# Altium footprint library LTEWlib.PcbLib: 125 footprints (part 8 of 8)
Each footprint in its own frame and in the unit in brackets; x right, y up, seen from the top. Pads: shape width x height; smd on the part's side, far side on the other; paste and mask are expansions set on the pad; w line width, h text height; cw(c..) or ccw(c..) is an arc to the next point about the centre after c.
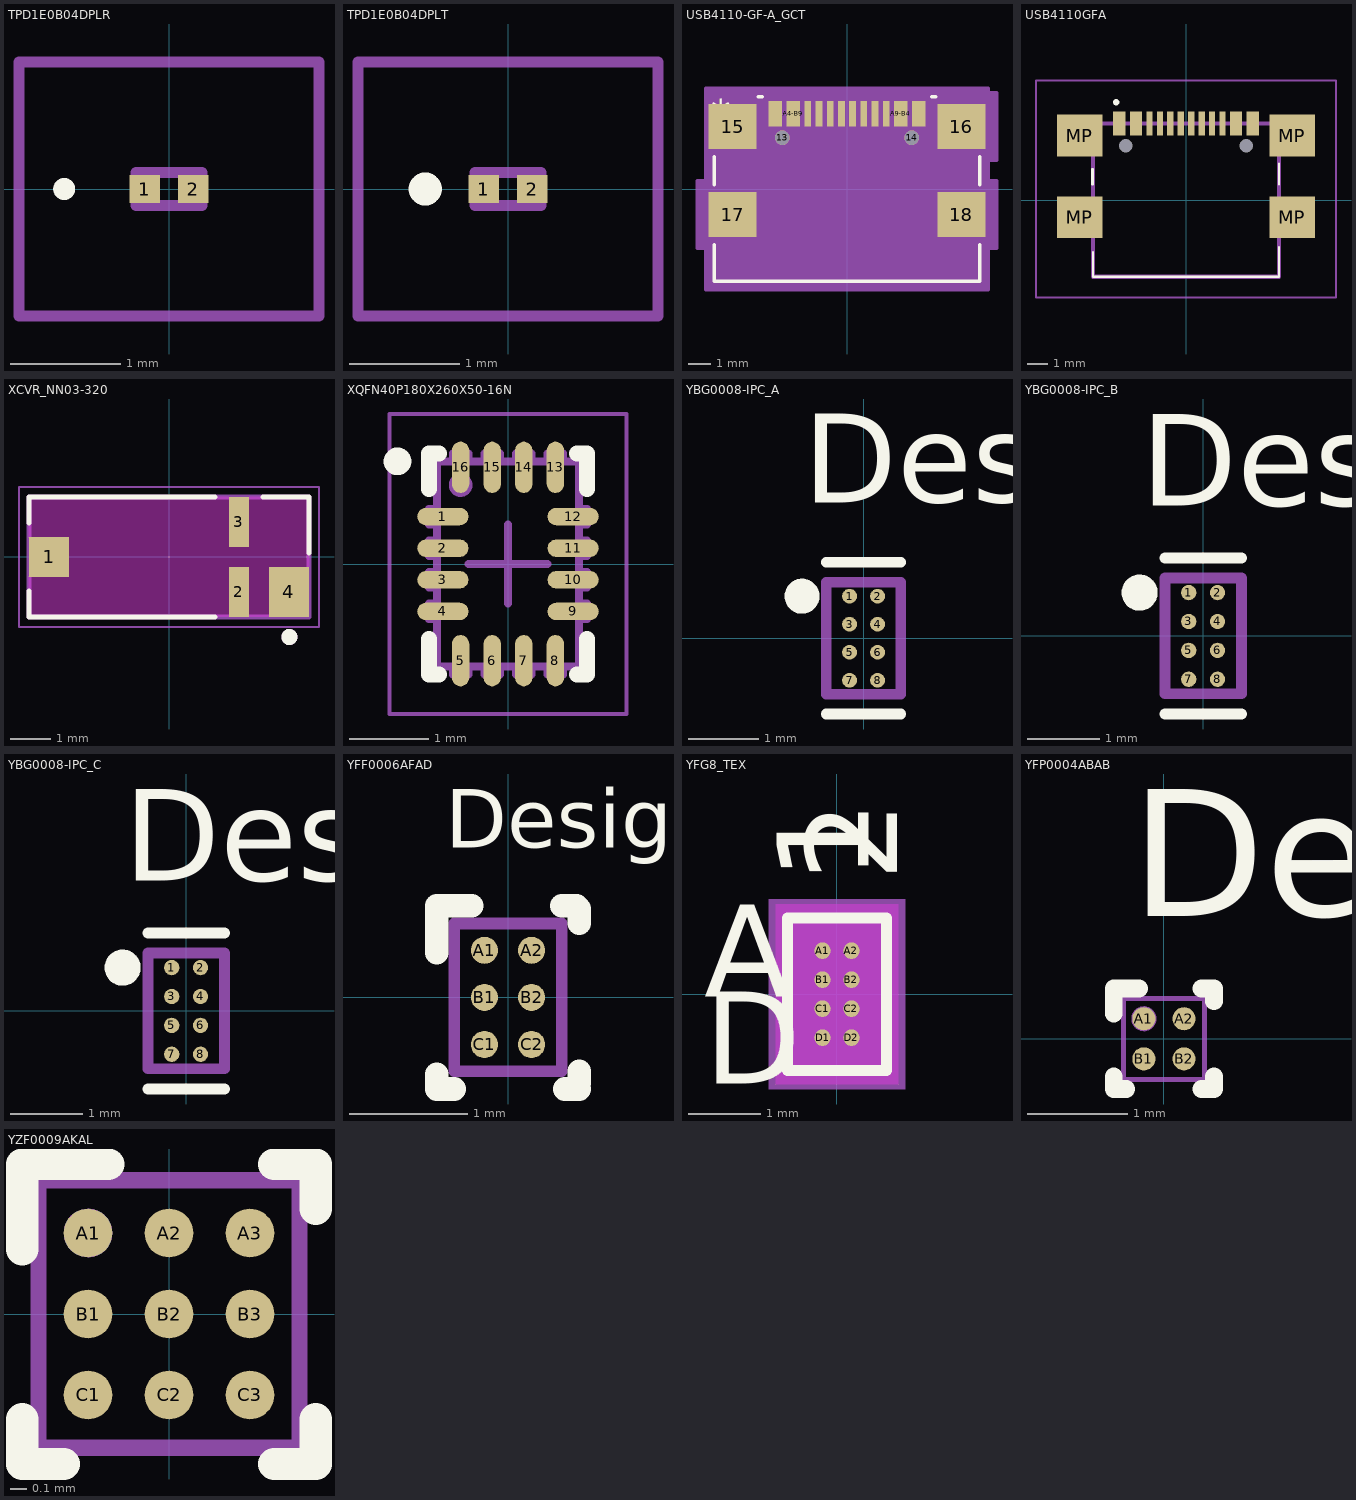
[diagram p7: the footprints below, top view; thin cyan lines are the x and y axes]

## TPD1E0B04DPLR [mm]
pads (2):
  rect 0.28x0.25 smd: 1(-0.22,0) 2(0.22,0)
Top Overlay:
  lines w0.1: -1,0 ccw(c-0.95,0) -0.9,0 ccw(c-0.95,0) -1,0
Mechanical 13:
  lines w0.1: -0.3,-0.15 -0.3,0.15 0.3,0.15 0.3,-0.15 -0.3,-0.15
Mechanical 15:
  lines w0.1: -1.36,-1.15 -1.36,1.15 1.36,1.15 1.36,-1.15 -1.36,-1.15
3D body "TPD1E0B04DPLR.stp": height 0.42, standoff 0, extent -0.335,-0.15 0.335,0.15

## TPD1E0B04DPLT [mm]
pads (2):
  rect 0.28x0.25 smd: 1(-0.22,0) 2(0.22,0)
Top Overlay:
  lines w0.2: -0.8,0 ccw(c-0.75,0) -0.7,0 ; -0.8,0 cw(c-0.75,0) -0.7,0 ; -0.8,0 ccw(c-0.75,0) -0.7,0
Mechanical 13:
  lines w0.1: -0.3,-0.15 0.3,-0.15 0.3,0.15 -0.3,0.15 -0.3,-0.15
Mechanical 15:
  lines w0.1: -1.36,-1.15 1.36,-1.15 1.36,1.15 -1.36,1.15 -1.36,-1.15
3D body "TPD1E0B04DPLT.stp": height 0.42, standoff 0, extent -0.335,-0.15 0.335,0.15

## USB4110-GF-A_GCT [mil]
pads (18):
  round 26 hole 26 unplated: 13(-113.78,90.07) 14(113.78,90.07)
  rect 85x79 smd: 15(-201.18,109.76) 16(201.18,109.76) 17(-201.18,-44.97) 18(201.18,-44.97)
  rect 24x45 smd paste+0 mask+0: A1-B12(-125.98,132.39) A4-B9(-94.49,132.39) A9-B4(94.49,132.39) A12-B1(125.98,132.39)
  rect 12x45 smd paste+0 mask+0: A5(-49.21,132.39) A6(-9.84,132.39) A7(9.84,132.39) A8(49.21,132.39) B5(68.9,132.39) B6(29.53,132.39) B7(-29.53,132.39) B8(-68.9,132.39)
Top Overlay:
  lines w6: -233.5,-97.57 -233.5,-162 233.5,-162 233.5,-97.57 ; -233.5,7.63 -233.5,57.16 ; -155.65,162 -148.99,162 ; 148.99,162 155.65,162 ; 233.5,7.63 233.5,57.16
  text "*" at -238.48,107.39 h50
Mechanical 5:
  region: -243.5,172 243.5,172 243.5,-172 -243.5,-172
Mechanical 13:
  lines w1: -228.5,-157 228.5,-157 228.5,157 -228.5,157 -228.5,-157
  text "*" at -238.48,107.39 h50
Mechanical 15:
  region: -263.68,-104.47 -248.5,-104.47 -248.5,-177 248.5,-177 248.5,-104.47 263.68,-104.47 263.68,14.53 248.5,14.53 248.5,50.26 263.68,50.26 263.68,169.26 248.5,169.26 248.5,177 -248.5,177 -248.5,14.53 -263.68,14.53
  lines w6: -263.68,-104.47 -248.5,-104.47 -248.5,-177 248.5,-177 248.5,-104.47 263.68,-104.47 263.68,14.53 248.5,14.53 248.5,50.26 263.68,50.26 263.68,169.26 248.5,169.26 248.5,177 -248.5,177 -248.5,14.53 -263.68,14.53 -263.68,-104.47
3D body "USB4110-GF-A--3DModel-STEP-269445.STEP": height 128.35, standoff -24.61, extent -224.88,-161.57 220,141.57
3D body: height 10, standoff 0, extent 0,0 10,10

## USB4110GFA [mm]
pads (22):
  rect 0.3x1.15 smd: A1(-3.35,3.678) A4(-2.55,3.678) A5(-1.25,3.678) A6(-0.25,3.678) A7(0.25,3.678) A8(1.25,3.678) A9(2.55,3.678) A12(3.35,3.678) B1(3.05,3.678) B4(2.25,3.678) B5(1.75,3.678) B6(0.75,3.678) B7(-0.75,3.678) B8(-1.75,3.678) B9(-2.25,3.678) B12(-3.05,3.678)
  round 0.325 hole 0.65 unplated: MH1(-2.89,2.603) MH2(2.89,2.603)
  rect 2.18x2 smd: MP(-5.11,-0.827) MP(-5.11,3.103) MP(5.11,-0.827) MP(5.11,3.103)
Top Overlay:
  lines w0.1: -4.47,-3.677 4.47,-3.677 ; -4.47,-3.677 4.47,-3.677 ; -4.47,-3.677 -4.47,-2.5 -4.47,-3.677 ; 4.47,-3.677 4.47,-2.25 4.47,-3.677 ; -4.5,0.75 -4.47,0.75 -4.47,1.5 -4.5,1.5 -4.5,0.75 ; 4.47,0.75 4.47,1.75 4.47,0.75
  lines w0.2: -3.4,4.7 ccw(c-3.35,4.7) -3.3,4.7 ; -3.4,4.7 cw(c-3.35,4.7) -3.3,4.7 ; -3.4,4.7 ccw(c-3.35,4.7) -3.3,4.7
Mechanical 13:
  lines w0.2: -4.47,-3.677 -4.47,3.673 4.47,3.673 4.47,-3.677 -4.47,-3.677
Mechanical 15:
  lines w0.1: -7.2,-4.677 -7.2,5.75 7.2,5.75 7.2,-4.677 -7.2,-4.677
3D body "USB4110-GF-A.stp": height 3.26, standoff -0.63, extent -5.65,-3.68 5.65,4.02

## XCVR_NN03-320 [mm]
pads (4):
  rect 1x1 smd: 1(-3,0)
  rect 0.5x1.25 smd: 2(1.75,-0.875) 3(1.75,0.875)
  rect 1x1.25 smd: 4(3,-0.875)
Top Overlay:
  circle w0.2: c3.01,-2 r0.1
  lines w0.127: -3.5,-0.85 -3.5,-1.5 1.15,-1.5 ; -3.5,0.85 -3.5,1.5 1.15,1.5 ; 2.35,1.5 3.5,1.5 3.5,0.1
Keep-Out Layer:
  region: 3.5,-0.25 2.5,-0.25 2.5,-1.5 2,-1.5 2,-0.25 1.5,-0.25 1.5,-1.5 -3.5,-1.5 -3.5,-0.5 -2.5,-0.5 -2.5,0.5 -3.5,0.5 -3.5,1.5 1.5,1.5 1.5,0.25 2,0.25 2,1.5 3.5,1.5
  region: 3.5,-0.25 2.5,-0.25 2.5,-1.5 2,-1.5 2,-0.25 1.5,-0.25 1.5,-1.5 -3.5,-1.5 -3.5,-0.5 -2.5,-0.5 -2.5,0.5 -3.5,0.5 -3.5,1.5 1.5,1.5 1.5,0.25 2,0.25 2,1.5 3.5,1.5
Mechanical 13:
  circle w0.2: c3.01,-2 r0.1
  lines w0.127: -3.5,-1.5 -3.5,1.5 3.5,1.5 3.5,-1.5 -3.5,-1.5
Mechanical 15:
  lines w0.05: -3.75,-1.75 3.75,-1.75 3.75,1.75 -3.75,1.75 -3.75,-1.75
3D body "step_temp.STEP": height 2.02, standoff 0, extent -3.5,-1.5 3.5,1.5

## XQFN40P180X260X50-16N [mm]
pads (16):
  oval 0.65x0.22 smd paste-0.02 mask+0.04: 1(-0.825,0.6) 2(-0.825,0.2) 3(-0.825,-0.2) 4(-0.825,-0.6) 9(0.825,-0.6) 10(0.825,-0.2) 11(0.825,0.2) 12(0.825,0.6)
  oval 0.22x0.65 smd paste-0.02 mask+0.04: 5(-0.6,-1.225) 6(-0.2,-1.225) 7(0.2,-1.225) 8(0.6,-1.225) 13(0.6,1.225) 14(0.2,1.225) 15(-0.2,1.225) 16(-0.6,1.225)
Top Overlay:
  circle w0.25: c-1.4,1.3 r0.05
  lines w0.2: -1,-0.95 -1,-1.4 -0.875,-1.4 ; -1,0.95 -1,1.4 -0.875,1.4 ; 0.875,-1.4 1,-1.4 1,-0.95 ; 0.875,1.4 1,1.4 1,0.95
Mechanical 7:
  circle w0.1: c-0.6,1 r0.1
  lines w0.1: -0.9,-0.7 -1,-0.7 -1,-0.5 -0.9,-0.5 ; -0.9,-0.3 -1,-0.3 -1,-0.1 -0.9,-0.1 ; -0.9,0.1 -1,0.1 -1,0.3 -0.9,0.3 ; -0.9,0.5 -1,0.5 -1,0.7 -0.9,0.7 ; -0.7,-1.3 -0.7,-1.4 -0.5,-1.4 -0.5,-1.3 ; -0.7,1.3 -0.7,1.4 -0.5,1.4 -0.5,1.3 ; -0.3,-1.3 -0.3,-1.4 -0.1,-1.4 -0.1,-1.3 ; -0.3,1.3 -0.3,1.4 -0.1,1.4 -0.1,1.3 ; 0.1,-1.3 0.1,-1.4 0.3,-1.4 0.3,-1.3 ; 0.1,1.3 0.1,1.4 0.3,1.4 0.3,1.3 ; 0.5,-1.3 0.5,-1.4 0.7,-1.4 0.7,-1.3 ; 0.5,1.3 0.5,1.4 0.7,1.4 0.7,1.3 ; 0.9,-0.7 1,-0.7 1,-0.5 0.9,-0.5 ; 0.9,-0.3 1,-0.3 1,-0.1 0.9,-0.1 ; 0.9,0.1 1,0.1 1,0.3 0.9,0.3 ; 0.9,0.5 1,0.5 1,0.7 0.9,0.7 ; -0.9,-1.3 0.9,-1.3 0.9,1.3 -0.9,1.3 -0.9,-1.3
  text ".Designator" at -0.45,-0.2 h0.38
Mechanical 15:
  lines w0.05: -1.5,-1.9 1.5,-1.9 1.5,1.9 -1.5,1.9 -1.5,-1.9
  lines w0.1: -0.5,0 0.5,0 ; 0,-0.5 0,0.5
3D body: height 0.55, standoff 0.4, extent -0.9,-0.35 0.9,0.35
3D body "User Library-XQFN-16-1.step": height 0.55, standoff 0, extent -0.91,-1.31 0.91,1.31

## YBG0008-IPC_A [mm]
pads (8):
  round 0.212 smd paste+0 mask+0: 1(-0.2,0.6) 2(0.2,0.6) 3(-0.2,0.2) 4(0.2,0.2) 5(-0.2,-0.2) 6(0.2,-0.2) 7(-0.2,-0.6) 8(0.2,-0.6)
Top Overlay:
  circle w0.25: c-0.879,0.6 r0.125
  lines w0.15: -0.53,-1.081 0.53,-1.081 ; -0.53,1.081 0.53,1.081
  text "Designator210" at -0.864,1.93 h1.27
Mechanical 13:
  lines w0.15: -0.53,-0.8 -0.53,0.8 0.53,0.8 0.53,-0.8 -0.53,-0.8
  text ".Designator" at 0.889,-0.381 h1.27
3D body: height 0.25, standoff 0, extent 0,0 0.254,0.254
3D body "BQ25180YBGR.stp": height 0.5, standoff 0, extent -0.5,-0.775 0.5,0.775

## YBG0008-IPC_B [mm]
pads (8):
  round 0.212 smd paste+0 mask+0: 1(-0.2,0.6) 2(0.2,0.6) 3(-0.2,0.2) 4(0.2,0.2) 5(-0.2,-0.2) 6(0.2,-0.2) 7(-0.2,-0.6) 8(0.2,-0.6)
Top Overlay:
  circle w0.25: c-0.879,0.6 r0.125
  lines w0.15: -0.53,-1.081 0.53,-1.081 ; -0.53,1.081 0.53,1.081
  text "Designator209" at -0.864,1.803 h1.27
Mechanical 13:
  lines w0.15: -0.53,-0.8 0.53,-0.8 0.53,0.8 -0.53,0.8 -0.53,-0.8
  text ".Designator" at 0,-0.635 h1.27
3D body: height 0.25, standoff 0, extent 0,0 0.254,0.254
3D body "BQ25180YBGR.stp": height 0.5, standoff 0, extent -0.5,-0.775 0.5,0.775

## YBG0008-IPC_C [mm]
pads (8):
  round 0.212 smd paste+0 mask+0: 1(-0.2,0.6) 2(0.2,0.6) 3(-0.2,0.2) 4(0.2,0.2) 5(-0.2,-0.2) 6(0.2,-0.2) 7(-0.2,-0.6) 8(0.2,-0.6)
Top Overlay:
  circle w0.25: c-0.879,0.6 r0.125
  lines w0.15: -0.53,-1.081 0.53,-1.081 ; -0.53,1.081 0.53,1.081
  text "Designator208" at -0.864,1.803 h1.27
Mechanical 13:
  lines w0.15: -0.53,-0.8 -0.53,0.8 0.53,0.8 0.53,-0.8 -0.53,-0.8
  text ".Designator" at 0,-0.635 h1.27
3D body "BQ25180YBGR.stp": height 0.5, standoff 0, extent -0.5,-0.775 0.5,0.775
3D body: height 0.25, standoff 0, extent 0,0 0.254,0.254

## YFF0006AFAD [mm]
pads (6):
  round 0.23 smd paste-0.102 mask+0.038: A1(-0.2,0.4) A2(0.2,0.4) B1(-0.2,0) B2(0.2,0) C1(-0.2,-0.4) C2(0.2,-0.4)
Top Overlay:
  lines w0.2: -0.607,-0.653 -0.607,-0.778 -0.457,-0.778 ; -0.607,0.378 -0.607,0.778 -0.307,0.778 ; 0.457,0.778 0.582,0.778 ; 0.482,-0.778 0.607,-0.778 ; 0.607,-0.728 0.607,-0.628 ; 0.607,0.628 0.607,0.753
  text "Designator9" at -0.533,1.27 h0.5
Top Paste:
  circle w0.05: c0.275,0.325 r0.025
  circle w0.05: c0.125,0.475 r0.025
  circle w0.05: c0.275,0.475 r0.025
  circle w0.05: c0.125,0.325 r0.025
  circle w0.05: c0.125,-0.075 r0.025
  circle w0.05: c0.275,0.075 r0.025
  circle w0.05: c0.125,0.075 r0.025
  circle w0.05: c0.275,-0.075 r0.025
  circle w0.05: c0.125,-0.475 r0.025
  circle w0.05: c0.275,-0.325 r0.025
  circle w0.05: c0.125,-0.325 r0.025
  circle w0.05: c0.275,-0.475 r0.025
  circle w0.05: c-0.125,0.325 r0.025
  circle w0.05: c-0.275,0.475 r0.025
  circle w0.05: c-0.125,0.475 r0.025
  circle w0.05: c-0.275,0.325 r0.025
  circle w0.05: c-0.275,-0.075 r0.025
  circle w0.05: c-0.125,0.075 r0.025
  circle w0.05: c-0.275,0.075 r0.025
  circle w0.05: c-0.125,-0.075 r0.025
  circle w0.05: c-0.275,-0.475 r0.025
  circle w0.05: c-0.125,-0.325 r0.025
  circle w0.05: c-0.275,-0.325 r0.025
  circle w0.05: c-0.125,-0.475 r0.025
  region: 0.125,0.475 0.075,0.475 0.075,0.325 0.125,0.325
  region: 0.275,0.475 0.275,0.525 0.125,0.525 0.125,0.475
  region: 0.275,0.325 0.325,0.325 0.325,0.475 0.275,0.475
  region: 0.125,0.325 0.125,0.275 0.275,0.275 0.275,0.325
  region: 0.275,0.325 0.275,0.475 0.125,0.475 0.125,0.325
  region: 0.275,-0.075 0.275,0.075 0.125,0.075 0.125,-0.075
  region: 0.125,-0.075 0.125,-0.125 0.275,-0.125 0.275,-0.075
  region: 0.275,-0.075 0.325,-0.075 0.325,0.075 0.275,0.075
  region: 0.275,0.075 0.275,0.125 0.125,0.125 0.125,0.075
  region: 0.125,0.075 0.075,0.075 0.075,-0.075 0.125,-0.075
  region: 0.275,-0.475 0.275,-0.325 0.125,-0.325 0.125,-0.475
  region: 0.125,-0.475 0.125,-0.525 0.275,-0.525 0.275,-0.475
  region: 0.275,-0.475 0.325,-0.475 0.325,-0.325 0.275,-0.325
  region: 0.275,-0.325 0.275,-0.275 0.125,-0.275 0.125,-0.325
  region: 0.125,-0.325 0.075,-0.325 0.075,-0.475 0.125,-0.475
  region: -0.275,0.475 -0.325,0.475 -0.325,0.325 -0.275,0.325
  region: -0.125,0.475 -0.125,0.525 -0.275,0.525 -0.275,0.475
  region: -0.125,0.325 -0.075,0.325 -0.075,0.475 -0.125,0.475
  region: -0.275,0.325 -0.275,0.275 -0.125,0.275 -0.125,0.325
  region: -0.125,0.325 -0.125,0.475 -0.275,0.475 -0.275,0.325
  region: -0.125,-0.075 -0.125,0.075 -0.275,0.075 -0.275,-0.075
  region: -0.275,-0.075 -0.275,-0.125 -0.125,-0.125 -0.125,-0.075
  region: -0.125,-0.075 -0.075,-0.075 -0.075,0.075 -0.125,0.075
  region: -0.125,0.075 -0.125,0.125 -0.275,0.125 -0.275,0.075
  region: -0.275,0.075 -0.325,0.075 -0.325,-0.075 -0.275,-0.075
  region: -0.125,-0.475 -0.125,-0.325 -0.275,-0.325 -0.275,-0.475
  region: -0.275,-0.475 -0.275,-0.525 -0.125,-0.525 -0.125,-0.475
  region: -0.125,-0.475 -0.075,-0.475 -0.075,-0.325 -0.125,-0.325
  region: -0.125,-0.325 -0.125,-0.275 -0.275,-0.275 -0.275,-0.325
  region: -0.275,-0.325 -0.325,-0.325 -0.325,-0.475 -0.275,-0.475
Mechanical 13:
  circle w0.06: c-0.2,0.4 r0.08
  lines w0.1: -0.457,-0.628 0.457,-0.628 0.457,0.628 -0.457,0.628 -0.457,-0.628
  text ".Designator" at 0.86,-0.55 h0.5
3D body: height 0.25, standoff 0, extent 0,0 0.254,0.254
3D body "TPS610992YFFT.stp": height 0.63, standoff 0, extent -0.442,-0.613 0.442,0.613

## YFG8_TEX [mil]
pads (8):
  round 9 smd paste+0 mask+0: A1(-7.87,23.62) A2(7.87,23.62) B1(-7.87,7.88) B2(7.87,7.88) C1(-7.87,-7.88) C2(7.87,-7.88) D1(-7.87,-23.62) D2(7.87,-23.62)
Top Overlay:
  lines w6: -27,-41.5 27,-41.5 27,41.5 -27,41.5 -27,-41.5
  text "A" at -72,-1.38 h50
  text "D" at -72,-48.62 h50
  text "1" at 17.13,61.5 h50
  text "2" at 32.87,61.5 h50
Bottom Overlay:
  text "A" at -47,-1.38 h50
  text "D" at -47,-48.62 h50
  text "1" at -32.87,61.5 h50
  text "2" at -17.13,61.5 h50
Keep-Out Layer:
  region: -33.25,-49 -33.25,49 33.25,49 33.25,-49
Mechanical 5:
  region: 37,-51.5 -37,-51.5 -37,51.5 37,51.5
Mechanical 13:
  lines w1: -22,28.62 -14.13,36.5 ; -22,-36.5 22,-36.5 22,36.5 -22,36.5 -22,-36.5
  text "A" at -72,-1.38 h50
  text "D" at -72,-48.62 h50
  text "1" at 17.13,61.5 h50
  text "2" at 32.87,61.5 h50
Mechanical 15:
  region: 32,-46.5 -32,-46.5 -32,46.5 32,46.5
  lines w6: -32,-46.5 -32,46.5 32,46.5 32,-46.5 -32,-46.5
3D body "YFG8_TEX.step": height 25.12, standoff -0.01, extent -22.01,-36.5 22.01,36.5

## YFP0004ABAB [mm]
pads (4):
  round 0.23 smd paste-0.102 mask+0.038: A1(-0.2,0.2) A2(0.2,0.2) B1(-0.2,-0.2) B2(0.2,-0.2)
Top Overlay:
  lines w0.178: -0.5,-0.5 -0.5,-0.375 ; -0.5,0.25 -0.5,0.475 -0.5,0.5 -0.25,0.5 ; -0.475,-0.5 -0.375,-0.5 ; 0.375,-0.5 0.5,-0.5 ; 0.375,0.5 0.475,0.5 ; 0.5,-0.475 0.5,-0.375 ; 0.5,0.375 0.5,0.5
  text "Designator32" at -0.33,1.219 h1.27
Top Paste:
  circle w0.05: c-0.125,-0.125 r0.025
  circle w0.05: c-0.275,-0.275 r0.025
  circle w0.05: c-0.275,-0.125 r0.025
  circle w0.05: c-0.125,-0.275 r0.025
  circle w0.05: c0.275,-0.275 r0.025
  circle w0.05: c0.125,-0.125 r0.025
  circle w0.05: c0.125,-0.275 r0.025
  circle w0.05: c0.275,-0.125 r0.025
  circle w0.05: c-0.125,0.275 r0.025
  circle w0.05: c-0.275,0.125 r0.025
  circle w0.05: c-0.275,0.275 r0.025
  circle w0.05: c-0.125,0.125 r0.025
  circle w0.05: c0.275,0.125 r0.025
  circle w0.05: c0.125,0.275 r0.025
  circle w0.05: c0.125,0.125 r0.025
  circle w0.05: c0.275,0.275 r0.025
  region: -0.275,-0.275 -0.275,-0.325 -0.125,-0.325 -0.125,-0.275
  region: -0.275,-0.125 -0.325,-0.125 -0.325,-0.275 -0.275,-0.275
  region: -0.125,-0.125 -0.125,-0.075 -0.275,-0.075 -0.275,-0.125
  region: -0.125,-0.275 -0.075,-0.275 -0.075,-0.125 -0.125,-0.125
  region: -0.125,-0.125 -0.275,-0.125 -0.275,-0.275 -0.125,-0.275
  region: 0.275,-0.125 0.125,-0.125 0.125,-0.275 0.275,-0.275
  region: 0.275,-0.275 0.325,-0.275 0.325,-0.125 0.275,-0.125
  region: 0.275,-0.125 0.275,-0.075 0.125,-0.075 0.125,-0.125
  region: 0.125,-0.125 0.075,-0.125 0.075,-0.275 0.125,-0.275
  region: 0.125,-0.275 0.125,-0.325 0.275,-0.325 0.275,-0.275
  region: -0.275,0.125 -0.275,0.075 -0.125,0.075 -0.125,0.125
  region: -0.275,0.275 -0.325,0.275 -0.325,0.125 -0.275,0.125
  region: -0.125,0.275 -0.125,0.325 -0.275,0.325 -0.275,0.275
  region: -0.125,0.125 -0.075,0.125 -0.075,0.275 -0.125,0.275
  region: -0.125,0.275 -0.275,0.275 -0.275,0.125 -0.125,0.125
  region: 0.275,0.275 0.125,0.275 0.125,0.125 0.275,0.125
  region: 0.275,0.125 0.325,0.125 0.325,0.275 0.275,0.275
  region: 0.275,0.275 0.275,0.325 0.125,0.325 0.125,0.275
  region: 0.125,0.275 0.075,0.275 0.075,0.125 0.125,0.125
  region: 0.125,0.125 0.125,0.075 0.275,0.075 0.275,0.125
Mechanical 13:
  circle w0.05: c-0.2,0.2 r0.1
  lines w0.05: -0.403,-0.403 -0.403,0.403 0.403,0.403 0.403,-0.403 -0.403,-0.403
  text ".Designator" at 0.71,-0.3 h1.27
3D body: height 0.25, standoff 0, extent 0,0 0.254,0.254
3D body: height 0.5, standoff 0, extent -0.381,-0.381 0.381,0.381

## YZF0009AKAL [mm]
pads (9):
  round 0.3 smd paste-0.137 mask+0.051: A1(-0.5,0.5) A2(0,0.5) A3(0.5,0.5) B1(-0.5,0) B2(0,0) B3(0.5,0) C1(-0.5,-0.5) C2(0,-0.5) C3(0.5,-0.5)
Top Overlay:
  lines w0.2: -0.905,-0.65 -0.905,-0.926 -0.65,-0.926 ; -0.905,0.4 -0.905,0.926 -0.375,0.926 ; 0.65,-0.926 0.905,-0.926 0.905,-0.65 ; 0.65,0.926 0.905,0.926 0.905,0.65
Top Paste:
  circle w0.05: c-0.6,0.4 r0.025
  circle w0.05: c-0.4,0.4 r0.025
  circle w0.05: c-0.4,0.6 r0.025
  circle w0.05: c-0.6,0.6 r0.025
  circle w0.05: c-0.1,0.4 r0.025
  circle w0.05: c0.1,0.4 r0.025
  circle w0.05: c0.1,0.6 r0.025
  circle w0.05: c-0.1,0.6 r0.025
  circle w0.05: c0.4,0.4 r0.025
  circle w0.05: c0.6,0.4 r0.025
  circle w0.05: c0.6,0.6 r0.025
  circle w0.05: c0.4,0.6 r0.025
  circle w0.05: c-0.6,-0.1 r0.025
  circle w0.05: c-0.4,-0.1 r0.025
  circle w0.05: c-0.4,0.1 r0.025
  circle w0.05: c-0.6,0.1 r0.025
  circle w0.05: c-0.1,-0.1 r0.025
  circle w0.05: c0.1,-0.1 r0.025
  circle w0.05: c0.1,0.1 r0.025
  circle w0.05: c-0.1,0.1 r0.025
  circle w0.05: c0.4,-0.1 r0.025
  circle w0.05: c0.6,-0.1 r0.025
  circle w0.05: c0.6,0.1 r0.025
  circle w0.05: c0.4,0.1 r0.025
  circle w0.05: c-0.6,-0.6 r0.025
  circle w0.05: c-0.4,-0.6 r0.025
  circle w0.05: c-0.4,-0.4 r0.025
  circle w0.05: c-0.6,-0.4 r0.025
  circle w0.05: c-0.1,-0.6 r0.025
  circle w0.05: c0.1,-0.6 r0.025
  circle w0.05: c0.1,-0.4 r0.025
  circle w0.05: c-0.1,-0.4 r0.025
  circle w0.05: c0.4,-0.6 r0.025
  circle w0.05: c0.6,-0.6 r0.025
  circle w0.05: c0.6,-0.4 r0.025
  circle w0.05: c0.4,-0.4 r0.025
  region: -0.6,0.35 -0.4,0.35 -0.4,0.65 -0.6,0.65
  region: -0.65,0.6 -0.65,0.4 -0.35,0.4 -0.35,0.6
  region: -0.1,0.35 0.1,0.35 0.1,0.65 -0.1,0.65
  region: -0.15,0.6 -0.15,0.4 0.15,0.4 0.15,0.6
  region: 0.4,0.35 0.6,0.35 0.6,0.65 0.4,0.65
  region: 0.35,0.6 0.35,0.4 0.65,0.4 0.65,0.6
  region: -0.6,-0.15 -0.4,-0.15 -0.4,0.15 -0.6,0.15
  region: -0.65,0.1 -0.65,-0.1 -0.35,-0.1 -0.35,0.1
  region: -0.1,-0.15 0.1,-0.15 0.1,0.15 -0.1,0.15
  region: -0.15,0.1 -0.15,-0.1 0.15,-0.1 0.15,0.1
  region: 0.4,-0.15 0.6,-0.15 0.6,0.15 0.4,0.15
  region: 0.35,0.1 0.35,-0.1 0.65,-0.1 0.65,0.1
  region: -0.6,-0.65 -0.4,-0.65 -0.4,-0.35 -0.6,-0.35
  region: -0.65,-0.4 -0.65,-0.6 -0.35,-0.6 -0.35,-0.4
  region: -0.1,-0.65 0.1,-0.65 0.1,-0.35 -0.1,-0.35
  region: -0.15,-0.4 -0.15,-0.6 0.15,-0.6 0.15,-0.4
  region: 0.4,-0.65 0.6,-0.65 0.6,-0.35 0.4,-0.35
  region: 0.35,-0.4 0.35,-0.6 0.65,-0.6 0.65,-0.4
Mechanical 13:
  circle w0.1: c-0.5,0.5 r0.1
  lines w0.1: -0.805,-0.826 0.805,-0.826 0.805,0.826 -0.805,0.826 -0.805,-0.826
  text ".Designator" at -0.45,-0.76 h1.27
3D body: height 0.25, standoff 0, extent 0,0 0.254,0.254
3D body "BQ27421YZFT-G1A.stp": height 0.63, standoff 0, extent -0.81,-0.79 0.81,0.79